# Altium footprint library Connector.PcbLib: 536 footprints (part 17 of 34)
Each footprint in its own frame and in the unit in brackets; x right, y up, seen from the top. Pads: shape width x height; smd on the part's side, far side on the other; paste and mask are expansions set on the pad; w line width, h text height; cw(c..) or ccw(c..) is an arc to the next point about the centre after c.
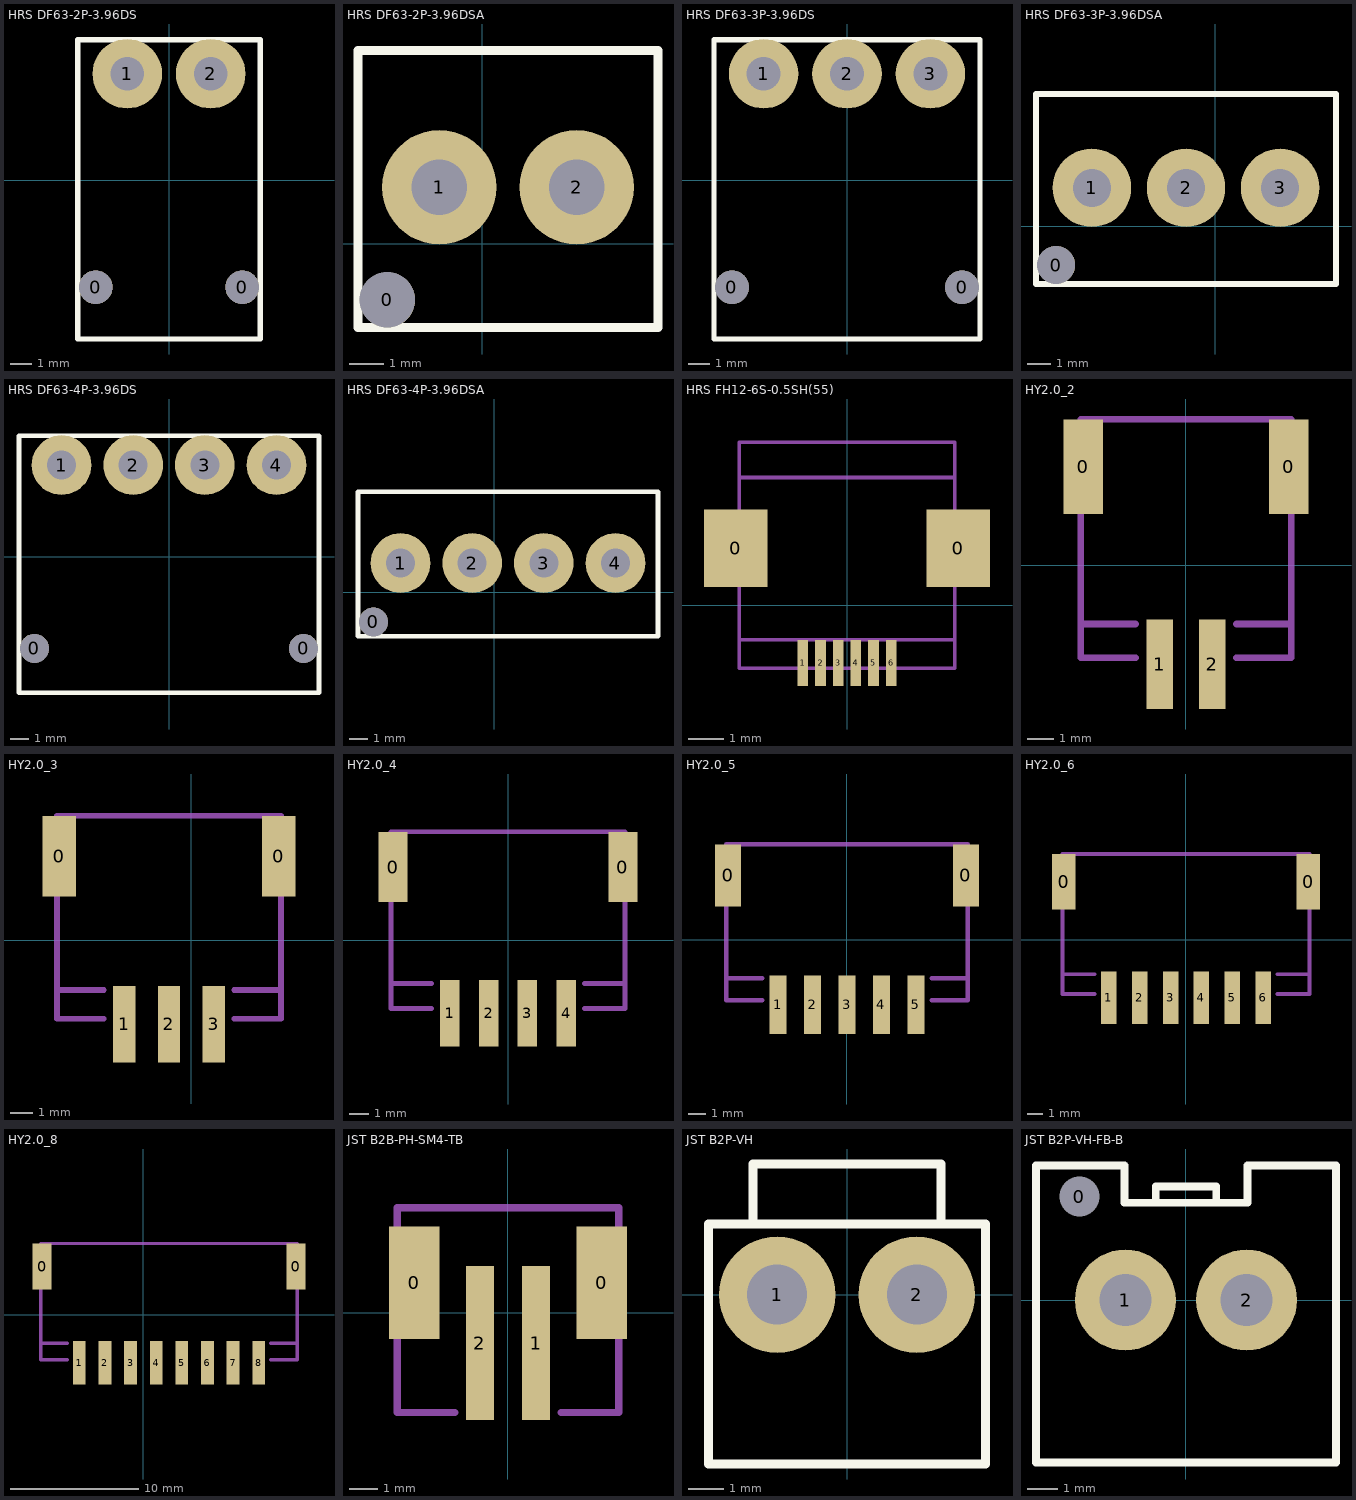
[diagram p16: the footprints below, top view; thin cyan lines are the x and y axes]

## HRS DF63-2P-3.96DS [mm]
pads (4):
  round 1.6 hole 1.6: 0(-3.48,-5.065) 0(3.48,-5.065)
  round 3.3 hole 1.6: 1(-1.98,5.065) 2(1.98,5.065)
Top Overlay:
  lines w0.254: -4.33,-7.525 4.33,-7.525 4.33,6.675 -4.33,6.675 -4.33,-7.525
3D body "DF63M-2P-3.96DS.stp": height 9.03, standoff -3.47, extent -4.33,-7.525 4.33,6.675

## HRS DF63-2P-3.96DSA [mm]
pads (3):
  round 1.6 hole 1.6: 0(-2.73,-1.625)
  round 3.3 hole 1.6: 1(-1.23,1.625) 2(2.73,1.625)
Top Overlay:
  lines w0.254: -3.58,-2.426 -3.58,5.575 5.08,5.575 5.08,-2.426 -3.58,-2.426
3D body "DF63M-2P-3.96DSA.stp": height 10.03, standoff -3.47, extent -3.58,-2.426 5.08,5.574

## HRS DF63-3P-3.96DS [mm]
pads (5):
  round 1.6 hole 1.6: 0(-5.46,-5.065) 0(5.46,-5.065)
  round 3.3 hole 1.6: 1(-3.96,5.065) 2(0,5.065) 3(3.96,5.065)
Top Overlay:
  lines w0.254: -6.31,-7.525 -6.31,6.675 6.31,6.675 6.31,-7.525 -6.31,-7.525
3D body "DF63M-3P-3.96DS.stp": height 9.03, standoff -3.47, extent -6.31,-7.525 6.31,6.675

## HRS DF63-3P-3.96DSA [mm]
pads (4):
  round 1.6 hole 1.6: 0(-6.69,-1.625)
  round 3.3 hole 1.6: 1(-5.19,1.625) 2(-1.23,1.625) 3(2.73,1.625)
Top Overlay:
  lines w0.254: -7.54,-2.426 5.08,-2.426 5.08,5.575 -7.54,5.575 -7.54,-2.426
3D body "DF63M-3P-3.96DSA.stp": height 10.03, standoff -3.47, extent -7.54,-2.425 5.08,5.575

## HRS DF63-4P-3.96DS [mm]
pads (6):
  round 1.6 hole 1.6: 0(-7.44,-5.065) 0(7.44,-5.065)
  round 3.3 hole 1.6: 1(-5.94,5.065) 2(-1.98,5.065) 3(1.98,5.065) 4(5.94,5.065)
Top Overlay:
  lines w0.254: -8.29,-7.525 -8.29,6.675 8.29,6.675 8.29,-7.525 -8.29,-7.525
3D body "DF63-4P-3.96DS.stp": height 9.03, standoff -3.47, extent -8.29,-7.525 8.29,6.675

## HRS DF63-4P-3.96DSA [mm]
pads (5):
  round 1.6 hole 1.6: 0(-6.69,-1.625)
  round 3.3 hole 1.6: 1(-5.19,1.625) 2(-1.23,1.625) 3(2.73,1.625) 4(6.69,1.625)
Top Overlay:
  lines w0.254: -7.54,-2.426 9.04,-2.426 9.04,5.575 -7.54,5.575 -7.54,-2.426
3D body "DF63M-4P-3.96DSA.stp": height 10.03, standoff -3.47, extent -7.54,-2.425 9.04,5.575

## HRS FH12-6S-0.5SH(55) [mm]
pads (8):
  rect 1.8x2.2 smd: 0(-3.15,1.625) 0(3.15,1.625)
  rect 0.3x1.3 smd: 1(-1.25,-1.625) 2(-0.75,-1.625) 3(-0.25,-1.625) 4(0.25,-1.625) 5(0.75,-1.625) 6(1.25,-1.625)
Mechanical 15:
  lines w0.102: -3.05,-0.975 3.05,-0.975 ; -3.05,1.025 -3.55,1.025 -3.55,2.225 -3.05,2.225 ; -3.05,3.625 3.05,3.625 ; 3.05,1.025 3.55,1.025 3.55,2.225 3.05,2.225 ; -3.05,-1.775 -3.05,4.625 3.05,4.625 3.05,-1.775 -3.05,-1.775
3D body "FH12-6S-0_5SH.STEP": height 2.09, standoff -0.01, extent -3.55,-1.775 3.55,4.625

## HY2.0_2 [mm]
pads (4):
  rect 1.5x3.6 smd: 0(-3.9,3.75) 0(3.9,3.75)
  rect 1x3.4 smd: 1(-1,-3.75) 2(1,-3.75)
Mechanical 15:
  lines w0.254: -4,-2.223 -1.918,-2.223 ; -4,5.563 4,5.563 ; -4,5.563 -4,-3.505 -1.918,-3.505 ; 1.918,-3.505 4,-3.505 4,5.563 ; 1.918,-2.223 4,-2.223
3D body: height 0.5, standoff 0, extent 0.75,-5.127 1.25,-1.88
3D body: height 2.25, standoff 1.95, extent 0.75,-2.223 1.25,2.587
3D body: height 4.5, standoff 0, extent 3.492,-2.223 4,5.569
3D body: height 2.25, standoff 0, extent 0.75,-2.337 1.25,-1.88
3D body: height 5.1, standoff 4.4, extent 1.181,-2.235 4,5.557
3D body: height 2, standoff 0, extent 3.492,-3.505 4,-2.223
3D body: height 2, standoff 0, extent -4,-3.505 -3.492,-2.223
3D body: height 5.1, standoff 4.4, extent -0.781,1.702 0.781,3.15
3D body: height 5.1, standoff 4.4, extent -4,-2.235 -1.181,5.557
3D body: height 4.5, standoff 0, extent -4,-2.235 4,-1.727
3D body: height 2.25, standoff 0, extent 0.75,-2.337 1.25,-1.88
3D body: height 2.25, standoff 0, extent -1.25,-2.337 -0.75,-1.88
3D body: height 4.5, standoff 0, extent -4,-2.223 -3.492,5.569
3D body: height 4.5, standoff 4, extent -4,-2.235 4,3.327
3D body: height 2.25, standoff 1.95, extent 0.75,-2.223 1.25,2.587
3D body: height 2.25, standoff 1.95, extent -1.25,-2.223 -0.75,2.587
3D body: height 0.5, standoff 0, extent -4,-2.235 4,5.557
3D body: height 0.5, standoff 0, extent 0.75,-5.127 1.25,-1.88
3D body: height 0.5, standoff 0, extent -1.25,-5.127 -0.75,-1.88

## HY2.0_3 [mm]
pads (5):
  rect 1.5x3.6 smd: 0(-5.9,3.75) 0(3.9,3.75)
  rect 1x3.4 smd: 1(-3,-3.75) 2(-1,-3.75) 3(1,-3.75)
Mechanical 15:
  lines w0.254: -6,-2.223 -3.918,-2.223 ; -3.918,-3.505 -6,-3.505 -6,5.563 4,5.563 4,-3.505 1.918,-3.505 ; 1.918,-2.223 4,-2.223
3D body: height 2, standoff 0, extent 3.492,-3.505 4,-2.223
3D body: height 5.1, standoff 4.4, extent 1.181,-2.235 4,5.557
3D body: height 4.5, standoff 0, extent 3.492,-2.223 4,5.569
3D body: height 0.5, standoff 0, extent -3.25,-5.127 -2.75,-1.88
3D body: height 0.5, standoff 0, extent -1.25,-5.127 -0.75,-1.88
3D body: height 0.5, standoff 0, extent 0.75,-5.127 1.25,-1.88
3D body: height 0.5, standoff 0, extent -6,-2.235 4,5.557
3D body: height 2.25, standoff 1.95, extent -3.25,-2.223 -2.75,2.587
3D body: height 2.25, standoff 1.95, extent -1.25,-2.223 -0.75,2.587
3D body: height 2.25, standoff 1.95, extent 0.75,-2.223 1.25,2.587
3D body: height 4.5, standoff 4, extent -6,-2.235 4,3.327
3D body: height 4.5, standoff 0, extent -6,-2.223 -5.492,5.569
3D body: height 2.25, standoff 0, extent -3.25,-2.337 -2.75,-1.88
3D body: height 2.25, standoff 0, extent -1.25,-2.337 -0.75,-1.88
3D body: height 2.25, standoff 0, extent 0.75,-2.337 1.25,-1.88
3D body: height 4.5, standoff 0, extent -6,-2.235 4,-1.727
3D body: height 5.1, standoff 4.4, extent -6,-2.235 -3.181,5.557
3D body: height 5.1, standoff 4.4, extent -2.146,1.702 0.152,3.15
3D body: height 2, standoff 0, extent -6,-3.505 -5.492,-2.223

## HY2.0_4 [mm]
pads (6):
  rect 1.5x3.6 smd: 0(-5.9,3.75) 0(5.9,3.75)
  rect 1x3.4 smd: 1(-3,-3.75) 2(-1,-3.75) 3(1,-3.75) 4(3,-3.75)
Mechanical 15:
  lines w0.254: -6,-2.223 -3.918,-2.223 ; -3.918,-3.505 -6,-3.505 -6,5.563 6,5.563 6,-3.505 3.918,-3.505 ; 3.918,-2.223 6,-2.223
3D body: height 0.5, standoff 0, extent -3.25,-5.127 -2.75,-1.88
3D body: height 0.5, standoff 0, extent -1.25,-5.127 -0.75,-1.88
3D body: height 0.5, standoff 0, extent 0.75,-5.127 1.25,-1.88
3D body: height 0.5, standoff 0, extent -6,-2.235 6,5.557
3D body: height 2.25, standoff 1.95, extent -3.25,-2.223 -2.75,2.587
3D body: height 2.25, standoff 1.95, extent -1.25,-2.223 -0.75,2.587
3D body: height 2.25, standoff 1.95, extent 0.75,-2.223 1.25,2.587
3D body: height 4.5, standoff 4, extent -6,-2.235 6,3.327
3D body: height 4.5, standoff 0, extent -6,-2.223 -5.492,5.569
3D body: height 4.5, standoff 0, extent 5.492,-2.223 6,5.569
3D body: height 2.25, standoff 0, extent -3.25,-2.337 -2.75,-1.88
3D body: height 2.25, standoff 0, extent -1.25,-2.337 -0.75,-1.88
3D body: height 2.25, standoff 0, extent 0.75,-2.337 1.25,-1.88
3D body: height 4.5, standoff 0, extent -6,-2.235 6,-1.727
3D body: height 5.1, standoff 4.4, extent -6,-2.235 -3.181,5.557
3D body: height 5.1, standoff 4.4, extent -2.146,1.702 2.146,3.15
3D body: height 5.1, standoff 4.4, extent 3.181,-2.223 6,5.569
3D body: height 2, standoff 0, extent -6,-3.505 -5.492,-2.223
3D body: height 2, standoff 0, extent 5.492,-3.505 6,-2.223
3D body: height 2.25, standoff 1.95, extent 2.75,-2.223 3.25,2.587
3D body: height 2.25, standoff 0, extent 2.75,-2.337 3.25,-1.88
3D body: height 0.5, standoff 0, extent 2.75,-5.127 3.25,-1.88

## HY2.0_5 [mm]
pads (7):
  rect 1.5x3.6 smd: 0(-6.9,3.75) 0(6.9,3.75)
  rect 1x3.4 smd: 1(-4,-3.75) 2(-2,-3.75) 3(0,-3.75) 4(2,-3.75) 5(4,-3.75)
Mechanical 15:
  lines w0.254: -7,-2.223 -4.918,-2.223 ; -4.918,-3.505 -7,-3.505 -7,5.563 7,5.563 7,-3.505 4.918,-3.505 ; 4.918,-2.223 7,-2.223
3D body: height 0.5, standoff 0, extent -4.25,-5.127 -3.75,-1.88
3D body: height 0.5, standoff 0, extent -2.25,-5.127 -1.75,-1.88
3D body: height 0.5, standoff 0, extent -0.25,-5.127 0.25,-1.88
3D body: height 0.5, standoff 0, extent 1.75,-5.127 2.25,-1.88
3D body: height 0.5, standoff 0, extent 3.75,-5.127 4.25,-1.88
3D body: height 0.5, standoff 0, extent -7,-2.235 7,5.557
3D body: height 2.25, standoff 0, extent -4.25,-2.337 -3.75,-1.88
3D body: height 2.25, standoff 1.95, extent -4.25,-2.223 -3.75,2.587
3D body: height 2.25, standoff 1.95, extent -2.25,-2.223 -1.75,2.587
3D body: height 2.25, standoff 1.95, extent -0.25,-2.223 0.25,2.587
3D body: height 2.25, standoff 1.95, extent 1.75,-2.223 2.25,2.587
3D body: height 2.25, standoff 1.95, extent 3.75,-2.223 4.25,2.587
3D body: height 4.5, standoff 4, extent -7,-2.235 7,3.327
3D body: height 4.5, standoff 0, extent -7,-2.235 -6.492,5.557
3D body: height 2.25, standoff 0, extent -2.25,-2.337 -1.75,-1.88
3D body: height 2.25, standoff 0, extent -0.25,-2.337 0.25,-1.88
3D body: height 2.25, standoff 0, extent 1.75,-2.337 2.25,-1.88
3D body: height 2.25, standoff 0, extent 3.75,-2.337 4.25,-1.88
3D body: height 4.5, standoff 0, extent -7,-2.235 7,-1.727
3D body: height 5.1, standoff 4.4, extent -7,-2.235 -4.182,5.557
3D body: height 5.1, standoff 4.4, extent -3.178,1.702 3.175,3.15
3D body: height 2, standoff 0, extent -7,-3.505 -6.492,-2.223
3D body: height 2, standoff 0, extent 6.492,-3.505 7,-2.223
3D body: height 5.1, standoff 4.4, extent 4.182,-2.235 7,5.557
3D body: height 4.5, standoff 0, extent 6.492,-2.235 7,5.557

## HY2.0_6 [mm]
pads (8):
  rect 1.5x3.6 smd: 0(-7.9,3.75) 0(7.9,3.75)
  rect 1x3.4 smd: 1(-5,-3.75) 2(-3,-3.75) 3(-1,-3.75) 4(1,-3.75) 5(3,-3.75) 6(5,-3.75)
Mechanical 15:
  lines w0.254: -8,-2.223 -5.918,-2.223 ; -5.918,-3.505 -8,-3.505 -8,5.563 8,5.563 8,-3.505 5.918,-3.505 ; 5.918,-2.223 8,-2.223
3D body: height 2, standoff 0, extent 7.492,-3.505 8,-2.223
3D body: height 2, standoff 0, extent -8,-3.505 -7.492,-2.223
3D body: height 5.1, standoff 4.4, extent 5.182,-2.235 8,5.557
3D body: height 5.1, standoff 4.4, extent -4.178,1.702 4.178,3.15
3D body: height 5.1, standoff 4.4, extent -8,-2.235 -5.182,5.557
3D body: height 4.5, standoff 0, extent -8,-2.235 8,-1.727
3D body: height 2.25, standoff 0, extent 4.75,-2.337 5.25,-1.88
3D body: height 2.25, standoff 0, extent 2.75,-2.337 3.25,-1.88
3D body: height 2.25, standoff 0, extent 0.75,-2.337 1.25,-1.88
3D body: height 2.25, standoff 0, extent -1.25,-2.337 -0.75,-1.88
3D body: height 2.25, standoff 0, extent -3.25,-2.337 -2.75,-1.88
3D body: height 4.5, standoff 0, extent 7.492,-2.235 8,5.557
3D body: height 4.5, standoff 0, extent -8,-2.235 -7.492,5.557
3D body: height 4.5, standoff 4, extent -8,-2.235 8,3.327
3D body: height 2.25, standoff 1.95, extent 4.75,-2.223 5.25,2.587
3D body: height 2.25, standoff 1.95, extent 2.75,-2.223 3.25,2.587
3D body: height 2.25, standoff 1.95, extent 0.75,-2.223 1.25,2.587
3D body: height 2.25, standoff 1.95, extent -1.25,-2.223 -0.75,2.587
3D body: height 2.25, standoff 1.95, extent -3.25,-2.223 -2.75,2.587
3D body: height 2.25, standoff 1.95, extent -5.25,-2.223 -4.75,2.587
3D body: height 2.25, standoff 0, extent -5.25,-2.337 -4.75,-1.88
3D body: height 0.5, standoff 0, extent -8,-2.235 8,5.557
3D body: height 0.5, standoff 0, extent 4.75,-5.127 5.25,-1.88
3D body: height 0.5, standoff 0, extent 2.75,-5.127 3.25,-1.88
3D body: height 0.5, standoff 0, extent 0.75,-5.127 1.25,-1.88
3D body: height 0.5, standoff 0, extent -1.25,-5.127 -0.75,-1.88
3D body: height 0.5, standoff 0, extent -3.25,-5.127 -2.75,-1.88
3D body: height 0.5, standoff 0, extent -5.25,-5.127 -4.75,-1.88

## HY2.0_8 [mm]
pads (10):
  rect 1.5x3.6 smd: 0(-7.9,3.75) 0(11.9,3.75)
  rect 1x3.4 smd: 1(-5,-3.75) 2(-3,-3.75) 3(-1,-3.75) 4(1,-3.75) 5(3,-3.75) 6(5,-3.75) 7(7,-3.75) 8(9,-3.75)
Mechanical 15:
  lines w0.254: -8,-2.223 -5.918,-2.223 ; -5.918,-3.505 -8,-3.505 -8,5.563 12,5.563 12,-3.505 9.918,-3.505 ; 9.918,-2.223 12,-2.223
3D body: height 2, standoff 0, extent -8,-3.505 -7.492,-2.223
3D body: height 5.1, standoff 4.4, extent -2.178,1.702 6.178,3.15
3D body: height 5.1, standoff 4.4, extent -8,-2.235 -5.182,5.557
3D body: height 4.5, standoff 0, extent -8,-2.235 12,-1.727
3D body: height 2.25, standoff 0, extent 4.75,-2.337 5.25,-1.88
3D body: height 2.25, standoff 0, extent 2.75,-2.337 3.25,-1.88
3D body: height 2.25, standoff 0, extent 0.75,-2.337 1.25,-1.88
3D body: height 2.25, standoff 0, extent -1.25,-2.337 -0.75,-1.88
3D body: height 2.25, standoff 0, extent -3.25,-2.337 -2.75,-1.88
3D body: height 4.5, standoff 0, extent -8,-2.235 -7.492,5.557
3D body: height 4.5, standoff 4, extent -8,-2.235 12,3.327
3D body: height 2.25, standoff 1.95, extent 4.75,-2.223 5.25,2.587
3D body: height 2.25, standoff 1.95, extent 2.75,-2.223 3.25,2.587
3D body: height 2.25, standoff 1.95, extent 0.75,-2.223 1.25,2.587
3D body: height 2.25, standoff 1.95, extent -1.25,-2.223 -0.75,2.587
3D body: height 2.25, standoff 1.95, extent -3.25,-2.223 -2.75,2.587
3D body: height 2.25, standoff 1.95, extent -5.25,-2.223 -4.75,2.587
3D body: height 2.25, standoff 0, extent -5.25,-2.337 -4.75,-1.88
3D body: height 0.5, standoff 0, extent -8,-2.235 12,5.557
3D body: height 0.5, standoff 0, extent 4.75,-5.127 5.25,-1.88
3D body: height 0.5, standoff 0, extent 2.75,-5.127 3.25,-1.88
3D body: height 0.5, standoff 0, extent 0.75,-5.127 1.25,-1.88
3D body: height 0.5, standoff 0, extent -1.25,-5.127 -0.75,-1.88
3D body: height 0.5, standoff 0, extent -3.25,-5.127 -2.75,-1.88
3D body: height 0.5, standoff 0, extent -5.25,-5.127 -4.75,-1.88
3D body: height 0.5, standoff 0, extent 6.75,-5.127 7.25,-1.88
3D body: height 0.5, standoff 0, extent 8.75,-5.127 9.25,-1.88
3D body: height 2.25, standoff 1.95, extent 6.75,-2.223 7.25,2.587
3D body: height 2.25, standoff 1.95, extent 8.75,-2.223 9.25,2.587
3D body: height 2.25, standoff 0, extent 6.75,-2.337 7.25,-1.88
3D body: height 2.25, standoff 0, extent 8.75,-2.337 9.25,-1.88
3D body: height 4.5, standoff 0, extent 11.492,-2.235 12,5.557
3D body: height 5.1, standoff 4.4, extent 9.182,-2.235 12,5.557
3D body: height 2, standoff 0, extent 11.492,-3.505 12,-2.223

## JST B2B-PH-SM4-TB [mm]
pads (4):
  rect 1.8x4 smd: 0(-3.35,1.075) 0(3.35,1.075)
  rect 1x5.5 smd: 1(1,-1.075) 2(-1,-1.075)
Mechanical 15:
  lines w0.254: -1.9,-3.55 -3.95,-3.55 -3.95,3.75 3.95,3.75 3.95,-3.55 1.9,-3.55
3D body "B2B-PH-SM4-TB.STEP": height 6.6, standoff 0, extent -3.975,-3.45 3.975,3.55

## JST B2P-VH [mm]
pads (2):
  round 3.3 hole 1.7: 1(-1.98,0) 2(1.98,0)
Top Overlay:
  lines w0.254: -2.667,2.007 -2.667,3.7 2.667,3.7 2.667,2.007 ; -3.93,-4.8 3.93,-4.8 3.93,2 -3.93,2 -3.93,-4.8
3D body "B2P-VH-B.STEP": height 10.9, standoff -3.7, extent -3.923,-4.817 3.937,3.683

## JST B2P-VH-FB-B [mm]
pads (3):
  round 1 hole 1.3: 0(-3.48,3.378)
  round 3.3 hole 1.7: 1(-1.98,0) 2(1.98,0)
Top Overlay:
  lines w0.254: -0.991,3.175 -0.991,3.708 0.991,3.708 0.991,3.175 ; 4.9,4.394 2.007,4.394 2.007,3.175 -2.007,3.175 -2.007,4.394 -4.9,4.394 -4.9,-5.309 4.9,-5.309 4.902,4.394
3D body "B2P-VH-FB-B.STEP": height 11.02, standoff -3.68, extent -4.9,-5.309 4.9,4.391